# Altium schematic symbol library jlcpcb_2025_04_capacitors_extended_1206.schlib: 2503 symbols (part 7 of 14) (continued)
## CC1206KKX5R8BB106
designator C?  Capacitance: 10uF  (hidden comment: *)
Capacitor, Ceramic (MLCC), 10uF, ±10%, 25V, X5R, ±10%, SMD 1206; Manufacturer: YAGEO; Manufacturer Part Number: CC1206KKX5R8BB106; Package Size: 1206; JLCPCB Basic Part: No; JLCPCB Part Number: C128855; Supplier 1: LCSC; Category: Capacitors - MLCC; Supplier Part Number 1: C128855; Tolerance: ±10%; Voltage Rating: 25V; Temperature Coefficient: X5R; RoHS: Yes; ComponentLink1Description: Datasheet; ComponentLink1URL: https://wmsc.lcsc.com/wmsc/upload/file/pdf/v2/lcsc/2407081117_YAGEO-CC1206KKX5R8BB106_C128855.pdf; ComponentLink2Description: JLCPCB Part URL; ComponentLink2URL: https://jlcpcb.com/partdetail/C128855; ComponentLink3Description: LCSC Part URL; ComponentLink3URL: https://lcsc.com/product-detail/Multilayer-Ceramic-Capacitors-MLCC---SMD-SMT_YAGEO-YAGEO-CC1206KKX5R8BB106_C128855.html
footprint CAP-1206 (1206 (3216M) Capacitor)
pins: 1, 2

## CC1206KKX5R8BB225
designator C?  Capacitance: 2.2uF  (hidden comment: *)
Capacitor, Ceramic (MLCC), 2.2uF, ±10%, 25V, X5R, ±10%, SMD 1206; Manufacturer: YAGEO; Manufacturer Part Number: CC1206KKX5R8BB225; Package Size: 1206; JLCPCB Basic Part: No; JLCPCB Part Number: C577207; Supplier 1: LCSC; Category: Capacitors - MLCC; Supplier Part Number 1: C577207; Tolerance: ±10%; Voltage Rating: 25V; Temperature Coefficient: X5R; RoHS: Yes; ComponentLink1Description: Datasheet; ComponentLink1URL: https://wmsc.lcsc.com/wmsc/upload/file/pdf/v2/lcsc/2407081117_YAGEO-CC1206KKX5R8BB225_C577207.pdf; ComponentLink2Description: JLCPCB Part URL; ComponentLink2URL: https://jlcpcb.com/partdetail/C577207; ComponentLink3Description: LCSC Part URL; ComponentLink3URL: https://lcsc.com/product-detail/Multilayer-Ceramic-Capacitors-MLCC---SMD-SMT_YAGEO-YAGEO-CC1206KKX5R8BB225_C577207.html
footprint CAP-1206 (1206 (3216M) Capacitor)
pins: 1, 2

## CC1206KKX5R8BB226
designator C?  Capacitance: 22uF  (hidden comment: *)
Capacitor, Ceramic (MLCC), 22uF, ±10%, 25V, X5R, ±10%, SMD 1206; Manufacturer: YAGEO; Manufacturer Part Number: CC1206KKX5R8BB226; Package Size: 1206; JLCPCB Basic Part: No; JLCPCB Part Number: C2178233; Supplier 1: LCSC; Category: Capacitors - MLCC; Supplier Part Number 1: C2178233; Tolerance: ±10%; Voltage Rating: 25V; Temperature Coefficient: X5R; RoHS: Yes; ComponentLink1Description: Datasheet; ComponentLink1URL: https://wmsc.lcsc.com/wmsc/upload/file/pdf/v2/lcsc/2407081117_YAGEO-CC1206KKX5R8BB226_C2178233.pdf; ComponentLink2Description: JLCPCB Part URL; ComponentLink2URL: https://jlcpcb.com/partdetail/C2178233; ComponentLink3Description: LCSC Part URL; ComponentLink3URL: https://lcsc.com/product-detail/Multilayer-Ceramic-Capacitors-MLCC---SMD-SMT_YAGEO-YAGEO-CC1206KKX5R8BB226_C2178233.html
footprint CAP-1206 (1206 (3216M) Capacitor)
pins: 1, 2

## CC1206KKX5R8BB475
designator C?  Capacitance: 4.7uF  (hidden comment: *)
Capacitor, Ceramic (MLCC), 4.7uF, ±10%, 25V, X5R, ±10%, SMD 1206; Manufacturer: YAGEO; Manufacturer Part Number: CC1206KKX5R8BB475; Package Size: 1206; JLCPCB Basic Part: No; JLCPCB Part Number: C577208; Supplier 1: LCSC; Category: Capacitors - MLCC; Supplier Part Number 1: C577208; Tolerance: ±10%; Voltage Rating: 25V; Temperature Coefficient: X5R; RoHS: Yes; ComponentLink1Description: Datasheet; ComponentLink1URL: https://wmsc.lcsc.com/wmsc/upload/file/pdf/v2/lcsc/2407081117_YAGEO-CC1206KKX5R8BB475_C577208.pdf; ComponentLink2Description: JLCPCB Part URL; ComponentLink2URL: https://jlcpcb.com/partdetail/C577208; ComponentLink3Description: LCSC Part URL; ComponentLink3URL: https://lcsc.com/product-detail/Multilayer-Ceramic-Capacitors-MLCC---SMD-SMT_YAGEO-YAGEO-CC1206KKX5R8BB475_C577208.html
footprint CAP-1206 (1206 (3216M) Capacitor)
pins: 1, 2

## CC1206KKX5R9BB105
designator C?  Capacitance: 1uF  (hidden comment: *)
Capacitor, Ceramic (MLCC), 1uF, ±10%, 50V, X5R, ±10%, SMD 1206; Manufacturer: YAGEO; Manufacturer Part Number: CC1206KKX5R9BB105; Package Size: 1206; JLCPCB Basic Part: No; JLCPCB Part Number: C577209; Supplier 1: LCSC; Category: Capacitors - MLCC; Supplier Part Number 1: C577209; Tolerance: ±10%; Voltage Rating: 50V; Temperature Coefficient: X5R; RoHS: Yes; ComponentLink1Description: Datasheet; ComponentLink1URL: https://wmsc.lcsc.com/wmsc/upload/file/pdf/v2/lcsc/2407081117_YAGEO-CC1206KKX5R9BB105_C577209.pdf; ComponentLink2Description: JLCPCB Part URL; ComponentLink2URL: https://jlcpcb.com/partdetail/C577209; ComponentLink3Description: LCSC Part URL; ComponentLink3URL: https://lcsc.com/product-detail/Multilayer-Ceramic-Capacitors-MLCC---SMD-SMT_YAGEO-YAGEO-CC1206KKX5R9BB105_C577209.html
footprint CAP-1206 (1206 (3216M) Capacitor)
pins: 1, 2

## CC1206KKX5R9BB106
designator C?  Capacitance: 10uF  (hidden comment: *)
Capacitor, Ceramic (MLCC), 10uF, ±10%, 50V, X5R, ±10%, SMD 1206; Manufacturer: YAGEO; Manufacturer Part Number: CC1206KKX5R9BB106; Package Size: 1206; JLCPCB Basic Part: No; JLCPCB Part Number: C100122; Supplier 1: LCSC; Category: Capacitors - MLCC; Supplier Part Number 1: C100122; Tolerance: ±10%; Voltage Rating: 50V; Temperature Coefficient: X5R; RoHS: Yes; ComponentLink1Description: Datasheet; ComponentLink1URL: https://wmsc.lcsc.com/wmsc/upload/file/pdf/v2/lcsc/2407081117_YAGEO-CC1206KKX5R9BB106_C100122.pdf; ComponentLink2Description: JLCPCB Part URL; ComponentLink2URL: https://jlcpcb.com/partdetail/C100122; ComponentLink3Description: LCSC Part URL; ComponentLink3URL: https://lcsc.com/product-detail/Multilayer-Ceramic-Capacitors-MLCC---SMD-SMT_YAGEO-YAGEO-CC1206KKX5R9BB106_C100122.html
footprint CAP-1206 (1206 (3216M) Capacitor)
pins: 1, 2

## CC1206KKX5R9BB225
designator C?  Capacitance: 2.2uF  (hidden comment: *)
Capacitor, Ceramic (MLCC), 2.2uF, ±10%, 50V, X5R, ±10%, SMD 1206; Manufacturer: YAGEO; Manufacturer Part Number: CC1206KKX5R9BB225; Package Size: 1206; JLCPCB Basic Part: No; JLCPCB Part Number: C577210; Supplier 1: LCSC; Category: Capacitors - MLCC; Supplier Part Number 1: C577210; Tolerance: ±10%; Voltage Rating: 50V; Temperature Coefficient: X5R; RoHS: Yes; ComponentLink1Description: Datasheet; ComponentLink1URL: https://wmsc.lcsc.com/wmsc/upload/file/pdf/v2/lcsc/2407081117_YAGEO-CC1206KKX5R9BB225_C577210.pdf; ComponentLink2Description: JLCPCB Part URL; ComponentLink2URL: https://jlcpcb.com/partdetail/C577210; ComponentLink3Description: LCSC Part URL; ComponentLink3URL: https://lcsc.com/product-detail/Multilayer-Ceramic-Capacitors-MLCC---SMD-SMT_YAGEO-YAGEO-CC1206KKX5R9BB225_C577210.html
footprint CAP-1206 (1206 (3216M) Capacitor)
pins: 1, 2

## CC1206KKX5R9BB475
designator C?  Capacitance: 4.7uF  (hidden comment: *)
Capacitor, Ceramic (MLCC), 4.7uF, ±10%, 50V, X5R, ±10%, SMD 1206; Manufacturer: YAGEO; Manufacturer Part Number: CC1206KKX5R9BB475; Package Size: 1206; JLCPCB Basic Part: No; JLCPCB Part Number: C723528; Supplier 1: LCSC; Category: Capacitors - MLCC; Supplier Part Number 1: C723528; Tolerance: ±10%; Voltage Rating: 50V; Temperature Coefficient: X5R; RoHS: Yes; ComponentLink1Description: Datasheet; ComponentLink1URL: https://wmsc.lcsc.com/wmsc/upload/file/pdf/v2/lcsc/2407081117_YAGEO-CC1206KKX5R9BB475_C723528.pdf; ComponentLink2Description: JLCPCB Part URL; ComponentLink2URL: https://jlcpcb.com/partdetail/C723528; ComponentLink3Description: LCSC Part URL; ComponentLink3URL: https://lcsc.com/product-detail/Multilayer-Ceramic-Capacitors-MLCC---SMD-SMT_YAGEO-YAGEO-CC1206KKX5R9BB475_C723528.html
footprint CAP-1206 (1206 (3216M) Capacitor)
pins: 1, 2

## CC1206KKX7R0BB104
designator C?  Capacitance: 100nF  (hidden comment: *)
Capacitor, Ceramic (MLCC), 100nF, ±10%, 100V, X7R, ±10%, SMD 1206; Manufacturer: YAGEO; Manufacturer Part Number: CC1206KKX7R0BB104; Package Size: 1206; JLCPCB Basic Part: No; JLCPCB Part Number: C107181; Supplier 1: LCSC; Category: Capacitors - MLCC; Supplier Part Number 1: C107181; Tolerance: ±10%; Voltage Rating: 100V; Temperature Coefficient: X7R; RoHS: Yes; ComponentLink1Description: Datasheet; ComponentLink1URL: https://wmsc.lcsc.com/wmsc/upload/file/pdf/v2/lcsc/2304140030_YAGEO-CC1206KKX7R0BB104_C107181.pdf; ComponentLink2Description: JLCPCB Part URL; ComponentLink2URL: https://jlcpcb.com/partdetail/C107181; ComponentLink3Description: LCSC Part URL; ComponentLink3URL: https://lcsc.com/product-detail/Multilayer-Ceramic-Capacitors-MLCC---SMD-SMT_YAGEO-YAGEO-CC1206KKX7R0BB104_C107181.html
footprint CAP-1206 (1206 (3216M) Capacitor)
pins: 1, 2

## CC1206KKX7R0BB105
designator C?  Capacitance: 1uF  (hidden comment: *)
Capacitor, Ceramic (MLCC), 1uF, ±10%, 100V, X7R, ±10%, SMD 1206; Manufacturer: YAGEO; Manufacturer Part Number: CC1206KKX7R0BB105; Package Size: 1206; JLCPCB Basic Part: No; JLCPCB Part Number: C70463; Supplier 1: LCSC; Category: Capacitors - MLCC; Supplier Part Number 1: C70463; Tolerance: ±10%; Voltage Rating: 100V; Temperature Coefficient: X7R; RoHS: Yes; ComponentLink1Description: Datasheet; ComponentLink1URL: https://wmsc.lcsc.com/wmsc/upload/file/pdf/v2/lcsc/2304140030_YAGEO-CC1206KKX7R0BB105_C70463.pdf; ComponentLink2Description: JLCPCB Part URL; ComponentLink2URL: https://jlcpcb.com/partdetail/C70463; ComponentLink3Description: LCSC Part URL; ComponentLink3URL: https://lcsc.com/product-detail/Multilayer-Ceramic-Capacitors-MLCC---SMD-SMT_YAGEO-YAGEO-CC1206KKX7R0BB105_C70463.html
footprint CAP-1206 (1206 (3216M) Capacitor)
pins: 1, 2

## CC1206KKX7R0BB224
designator C?  Capacitance: 220nF  (hidden comment: *)
Capacitor, Ceramic (MLCC), 220nF, ±10%, 100V, X7R, ±10%, SMD 1206; Manufacturer: YAGEO; Manufacturer Part Number: CC1206KKX7R0BB224; Package Size: 1206; JLCPCB Basic Part: No; JLCPCB Part Number: C113892; Supplier 1: LCSC; Category: Capacitors - MLCC; Supplier Part Number 1: C113892; Tolerance: ±10%; Voltage Rating: 100V; Temperature Coefficient: X7R; RoHS: Yes; ComponentLink1Description: Datasheet; ComponentLink1URL: https://wmsc.lcsc.com/wmsc/upload/file/pdf/v2/lcsc/2304140030_YAGEO-CC1206KKX7R0BB224_C113892.pdf; ComponentLink2Description: JLCPCB Part URL; ComponentLink2URL: https://jlcpcb.com/partdetail/C113892; ComponentLink3Description: LCSC Part URL; ComponentLink3URL: https://lcsc.com/product-detail/Multilayer-Ceramic-Capacitors-MLCC---SMD-SMT_YAGEO-YAGEO-CC1206KKX7R0BB224_C113892.html
footprint CAP-1206 (1206 (3216M) Capacitor)
pins: 1, 2

## CC1206KKX7R0BB225
designator C?  Capacitance: 2.2uF  (hidden comment: *)
Capacitor, Ceramic (MLCC), 2.2uF, ±10%, 100V, X7R, ±10%, SMD 1206; Manufacturer: YAGEO; Manufacturer Part Number: CC1206KKX7R0BB225; Package Size: 1206; JLCPCB Basic Part: No; JLCPCB Part Number: C577211; Supplier 1: LCSC; Category: Capacitors - MLCC; Supplier Part Number 1: C577211; Tolerance: ±10%; Voltage Rating: 100V; Temperature Coefficient: X7R; RoHS: Yes; ComponentLink1Description: Datasheet; ComponentLink1URL: https://wmsc.lcsc.com/wmsc/upload/file/pdf/v2/lcsc/2112151030_YAGEO-CC1206KKX7R0BB225_C577211.pdf; ComponentLink2Description: JLCPCB Part URL; ComponentLink2URL: https://jlcpcb.com/partdetail/C577211; ComponentLink3Description: LCSC Part URL; ComponentLink3URL: https://lcsc.com/product-detail/Multilayer-Ceramic-Capacitors-MLCC---SMD-SMT_YAGEO-YAGEO-CC1206KKX7R0BB225_C577211.html
footprint CAP-1206 (1206 (3216M) Capacitor)
pins: 1, 2

## CC1206KKX7R0BB334
designator C?  Capacitance: 330nF  (hidden comment: *)
Capacitor, Ceramic (MLCC), 330nF, ±10%, 100V, X7R, ±10%, SMD 1206; Manufacturer: YAGEO; Manufacturer Part Number: CC1206KKX7R0BB334; Package Size: 1206; JLCPCB Basic Part: No; JLCPCB Part Number: C577212; Supplier 1: LCSC; Category: Capacitors - MLCC; Supplier Part Number 1: C577212; Tolerance: ±10%; Voltage Rating: 100V; Temperature Coefficient: X7R; RoHS: Yes; ComponentLink1Description: Datasheet; ComponentLink1URL: https://wmsc.lcsc.com/wmsc/upload/file/pdf/v2/lcsc/2206021745_YAGEO-CC1206KKX7R0BB334_C577212.pdf; ComponentLink2Description: JLCPCB Part URL; ComponentLink2URL: https://jlcpcb.com/partdetail/C577212; ComponentLink3Description: LCSC Part URL; ComponentLink3URL: https://lcsc.com/product-detail/Multilayer-Ceramic-Capacitors-MLCC---SMD-SMT_YAGEO-YAGEO-CC1206KKX7R0BB334_C577212.html
footprint CAP-1206 (1206 (3216M) Capacitor)
pins: 1, 2

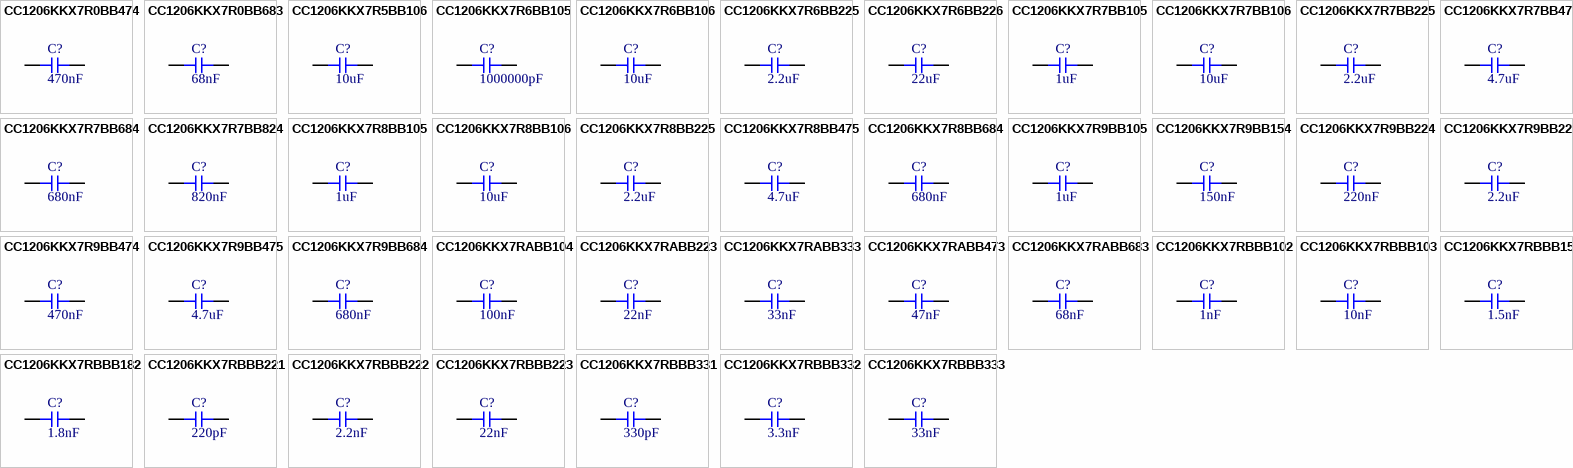
[diagram p30: symbols CC1206KKX7R0BB474 to CC1206KKX7RBBB333]

## CC1206KKX7R0BB474
designator C?  Capacitance: 470nF  (hidden comment: *)
Capacitor, Ceramic (MLCC), 470nF, ±10%, 100V, X7R, ±10%, SMD 1206; Manufacturer: YAGEO; Manufacturer Part Number: CC1206KKX7R0BB474; Package Size: 1206; JLCPCB Basic Part: No; JLCPCB Part Number: C107182; Supplier 1: LCSC; Category: Capacitors - MLCC; Supplier Part Number 1: C107182; Tolerance: ±10%; Voltage Rating: 100V; Temperature Coefficient: X7R; RoHS: Yes; ComponentLink1Description: Datasheet; ComponentLink1URL: https://wmsc.lcsc.com/wmsc/upload/file/pdf/v2/lcsc/2304140030_YAGEO-CC1206KKX7R0BB474_C107182.pdf; ComponentLink2Description: JLCPCB Part URL; ComponentLink2URL: https://jlcpcb.com/partdetail/C107182; ComponentLink3Description: LCSC Part URL; ComponentLink3URL: https://lcsc.com/product-detail/Multilayer-Ceramic-Capacitors-MLCC---SMD-SMT_YAGEO-YAGEO-CC1206KKX7R0BB474_C107182.html
footprint CAP-1206 (1206 (3216M) Capacitor)
pins: 1, 2

## CC1206KKX7R0BB683
designator C?  Capacitance: 68nF  (hidden comment: *)
Capacitor, Ceramic (MLCC), 68nF, ±10%, 100V, X7R, ±10%, SMD 1206; Manufacturer: YAGEO; Manufacturer Part Number: CC1206KKX7R0BB683; Package Size: 1206; JLCPCB Basic Part: No; JLCPCB Part Number: C327130; Supplier 1: LCSC; Category: Capacitors - MLCC; Supplier Part Number 1: C327130; Tolerance: ±10%; Voltage Rating: 100V; Temperature Coefficient: X7R; RoHS: Yes; ComponentLink1Description: Datasheet; ComponentLink1URL: https://wmsc.lcsc.com/wmsc/upload/file/pdf/v2/lcsc/1811141240_YAGEO-CC1206KKX7R0BB683_C327130.pdf; ComponentLink2Description: JLCPCB Part URL; ComponentLink2URL: https://jlcpcb.com/partdetail/C327130; ComponentLink3Description: LCSC Part URL; ComponentLink3URL: https://lcsc.com/product-detail/Multilayer-Ceramic-Capacitors-MLCC---SMD-SMT_YAGEO-YAGEO-CC1206KKX7R0BB683_C327130.html
footprint CAP-1206 (1206 (3216M) Capacitor)
pins: 1, 2

## CC1206KKX7R5BB106
designator C?  Capacitance: 10uF  (hidden comment: *)
Capacitor, Ceramic (MLCC), 10uF, ±10%, 6.3V, X7R, ±10%, SMD 1206; Manufacturer: YAGEO; Manufacturer Part Number: CC1206KKX7R5BB106; Package Size: 1206; JLCPCB Basic Part: No; JLCPCB Part Number: C2175333; Supplier 1: LCSC; Category: Capacitors - MLCC; Supplier Part Number 1: C2175333; Tolerance: ±10%; Voltage Rating: 6.3V; Temperature Coefficient: X7R; RoHS: Yes; ComponentLink1Description: Datasheet; ComponentLink1URL: https://wmsc.lcsc.com/wmsc/upload/file/pdf/v2/lcsc/2202040730_YAGEO-CC1206KKX7R5BB106_C2175333.pdf; ComponentLink2Description: JLCPCB Part URL; ComponentLink2URL: https://jlcpcb.com/partdetail/C2175333; ComponentLink3Description: LCSC Part URL; ComponentLink3URL: https://lcsc.com/product-detail/Multilayer-Ceramic-Capacitors-MLCC---SMD-SMT_YAGEO-YAGEO-CC1206KKX7R5BB106_C2175333.html
footprint CAP-1206 (1206 (3216M) Capacitor)
pins: 1, 2

## CC1206KKX7R6BB105
designator C?  Capacitance: 1000000pF  (hidden comment: *)
Capacitor, Ceramic (MLCC), 1000000pF, ±10%, 10V, X7R, ±10%, SMD 1206; Manufacturer: YAGEO; Manufacturer Part Number: CC1206KKX7R6BB105; Package Size: 1206; JLCPCB Basic Part: No; JLCPCB Part Number: C577213; Supplier 1: LCSC; Category: Capacitors - MLCC; Supplier Part Number 1: C577213; Tolerance: ±10%; Voltage Rating: 10V; Temperature Coefficient: X7R; RoHS: Yes; ComponentLink1Description: Datasheet; ComponentLink1URL: https://wmsc.lcsc.com/wmsc/upload/file/pdf/v2/lcsc/2211281000_YAGEO-CC1206KKX7R6BB105_C577213.pdf; ComponentLink2Description: JLCPCB Part URL; ComponentLink2URL: https://jlcpcb.com/partdetail/C577213; ComponentLink3Description: LCSC Part URL; ComponentLink3URL: https://lcsc.com/product-detail/Multilayer-Ceramic-Capacitors-MLCC---SMD-SMT_YAGEO-YAGEO-CC1206KKX7R6BB105_C577213.html
footprint CAP-1206 (1206 (3216M) Capacitor)
pins: 1, 2

## CC1206KKX7R6BB106
designator C?  Capacitance: 10uF  (hidden comment: *)
Capacitor, Ceramic (MLCC), 10uF, ±10%, 10V, X7R, ±10%, SMD 1206; Manufacturer: YAGEO; Manufacturer Part Number: CC1206KKX7R6BB106; Package Size: 1206; JLCPCB Basic Part: No; JLCPCB Part Number: C577214; Supplier 1: LCSC; Category: Capacitors - MLCC; Supplier Part Number 1: C577214; Tolerance: ±10%; Voltage Rating: 10V; Temperature Coefficient: X7R; RoHS: Yes; ComponentLink1Description: Datasheet; ComponentLink1URL: https://wmsc.lcsc.com/wmsc/upload/file/pdf/v2/lcsc/2204121100_YAGEO-CC1206KKX7R6BB106_C577214.pdf; ComponentLink2Description: JLCPCB Part URL; ComponentLink2URL: https://jlcpcb.com/partdetail/C577214; ComponentLink3Description: LCSC Part URL; ComponentLink3URL: https://lcsc.com/product-detail/Multilayer-Ceramic-Capacitors-MLCC---SMD-SMT_YAGEO-YAGEO-CC1206KKX7R6BB106_C577214.html
footprint CAP-1206 (1206 (3216M) Capacitor)
pins: 1, 2

## CC1206KKX7R6BB225
designator C?  Capacitance: 2.2uF  (hidden comment: *)
Capacitor, Ceramic (MLCC), 2.2uF, ±10%, 10V, X7R, ±10%, SMD 1206; Manufacturer: YAGEO; Manufacturer Part Number: CC1206KKX7R6BB225; Package Size: 1206; JLCPCB Basic Part: No; JLCPCB Part Number: C326852; Supplier 1: LCSC; Category: Capacitors - MLCC; Supplier Part Number 1: C326852; Tolerance: ±10%; Voltage Rating: 10V; Temperature Coefficient: X7R; RoHS: Yes; ComponentLink1Description: Datasheet; ComponentLink1URL: https://wmsc.lcsc.com/wmsc/upload/file/pdf/v2/lcsc/2311211121_YAGEO-CC1206KKX7R6BB225_C326852.pdf; ComponentLink2Description: JLCPCB Part URL; ComponentLink2URL: https://jlcpcb.com/partdetail/C326852; ComponentLink3Description: LCSC Part URL; ComponentLink3URL: https://lcsc.com/product-detail/Multilayer-Ceramic-Capacitors-MLCC---SMD-SMT_YAGEO-YAGEO-CC1206KKX7R6BB225_C326852.html
footprint CAP-1206 (1206 (3216M) Capacitor)
pins: 1, 2

## CC1206KKX7R6BB226
designator C?  Capacitance: 22uF  (hidden comment: *)
Capacitor, Ceramic (MLCC), 22uF, ±10%, 10V, X7R, ±10%, SMD 1206; Manufacturer: YAGEO; Manufacturer Part Number: CC1206KKX7R6BB226; Package Size: 1206; JLCPCB Basic Part: No; JLCPCB Part Number: C110045; Supplier 1: LCSC; Category: Capacitors - MLCC; Supplier Part Number 1: C110045; Tolerance: ±10%; Voltage Rating: 10V; Temperature Coefficient: X7R; RoHS: Yes; ComponentLink1Description: Datasheet; ComponentLink1URL: https://wmsc.lcsc.com/wmsc/upload/file/pdf/v2/lcsc/2207131630_YAGEO-CC1206KKX7R6BB226_C110045.pdf; ComponentLink2Description: JLCPCB Part URL; ComponentLink2URL: https://jlcpcb.com/partdetail/C110045; ComponentLink3Description: LCSC Part URL; ComponentLink3URL: https://lcsc.com/product-detail/Multilayer-Ceramic-Capacitors-MLCC---SMD-SMT_YAGEO-YAGEO-CC1206KKX7R6BB226_C110045.html
footprint CAP-1206 (1206 (3216M) Capacitor)
pins: 1, 2

## CC1206KKX7R7BB105
designator C?  Capacitance: 1uF  (hidden comment: *)
Capacitor, Ceramic (MLCC), 1uF, ±10%, 16V, X7R, ±10%, SMD 1206; Manufacturer: YAGEO; Manufacturer Part Number: CC1206KKX7R7BB105; Package Size: 1206; JLCPCB Basic Part: No; JLCPCB Part Number: C106236; Supplier 1: LCSC; Category: Capacitors - MLCC; Supplier Part Number 1: C106236; Tolerance: ±10%; Voltage Rating: 16V; Temperature Coefficient: X7R; RoHS: Yes; ComponentLink1Description: Datasheet; ComponentLink1URL: https://wmsc.lcsc.com/wmsc/upload/file/pdf/v2/lcsc/2304140030_YAGEO-CC1206KKX7R7BB105_C106236.pdf; ComponentLink2Description: JLCPCB Part URL; ComponentLink2URL: https://jlcpcb.com/partdetail/C106236; ComponentLink3Description: LCSC Part URL; ComponentLink3URL: https://lcsc.com/product-detail/Multilayer-Ceramic-Capacitors-MLCC---SMD-SMT_YAGEO-YAGEO-CC1206KKX7R7BB105_C106236.html
footprint CAP-1206 (1206 (3216M) Capacitor)
pins: 1, 2

## CC1206KKX7R7BB106
designator C?  Capacitance: 10uF  (hidden comment: *)
Capacitor, Ceramic (MLCC), 10uF, ±10%, 16V, X7R, ±10%, SMD 1206; Manufacturer: YAGEO; Manufacturer Part Number: CC1206KKX7R7BB106; Package Size: 1206; JLCPCB Basic Part: No; JLCPCB Part Number: C109464; Supplier 1: LCSC; Category: Capacitors - MLCC; Supplier Part Number 1: C109464; Tolerance: ±10%; Voltage Rating: 16V; Temperature Coefficient: X7R; RoHS: Yes; ComponentLink1Description: Datasheet; ComponentLink1URL: https://wmsc.lcsc.com/wmsc/upload/file/pdf/v2/lcsc/2304140030_YAGEO-CC1206KKX7R7BB106_C109464.pdf; ComponentLink2Description: JLCPCB Part URL; ComponentLink2URL: https://jlcpcb.com/partdetail/C109464; ComponentLink3Description: LCSC Part URL; ComponentLink3URL: https://lcsc.com/product-detail/Multilayer-Ceramic-Capacitors-MLCC---SMD-SMT_YAGEO-YAGEO-CC1206KKX7R7BB106_C109464.html
footprint CAP-1206 (1206 (3216M) Capacitor)
pins: 1, 2

## CC1206KKX7R7BB225
designator C?  Capacitance: 2.2uF  (hidden comment: *)
Capacitor, Ceramic (MLCC), 2.2uF, ±10%, 16V, X7R, ±10%, SMD 1206; Manufacturer: YAGEO; Manufacturer Part Number: CC1206KKX7R7BB225; Package Size: 1206; JLCPCB Basic Part: No; JLCPCB Part Number: C107183; Supplier 1: LCSC; Category: Capacitors - MLCC; Supplier Part Number 1: C107183; Tolerance: ±10%; Voltage Rating: 16V; Temperature Coefficient: X7R; RoHS: Yes; ComponentLink1Description: Datasheet; ComponentLink1URL: https://wmsc.lcsc.com/wmsc/upload/file/pdf/v2/lcsc/2304140030_YAGEO-CC1206KKX7R7BB225_C107183.pdf; ComponentLink2Description: JLCPCB Part URL; ComponentLink2URL: https://jlcpcb.com/partdetail/C107183; ComponentLink3Description: LCSC Part URL; ComponentLink3URL: https://lcsc.com/product-detail/Multilayer-Ceramic-Capacitors-MLCC---SMD-SMT_YAGEO-YAGEO-CC1206KKX7R7BB225_C107183.html
footprint CAP-1206 (1206 (3216M) Capacitor)
pins: 1, 2

## CC1206KKX7R7BB475
designator C?  Capacitance: 4.7uF  (hidden comment: *)
Capacitor, Ceramic (MLCC), 4.7uF, ±10%, 16V, X7R, ±10%, SMD 1206; Manufacturer: YAGEO; Manufacturer Part Number: CC1206KKX7R7BB475; Package Size: 1206; JLCPCB Basic Part: No; JLCPCB Part Number: C577216; Supplier 1: LCSC; Category: Capacitors - MLCC; Supplier Part Number 1: C577216; Tolerance: ±10%; Voltage Rating: 16V; Temperature Coefficient: X7R; RoHS: Yes; ComponentLink1Description: Datasheet; ComponentLink1URL: https://wmsc.lcsc.com/wmsc/upload/file/pdf/v2/lcsc/2008171234_YAGEO-CC1206KKX7R7BB475_C577216.pdf; ComponentLink2Description: JLCPCB Part URL; ComponentLink2URL: https://jlcpcb.com/partdetail/C577216; ComponentLink3Description: LCSC Part URL; ComponentLink3URL: https://lcsc.com/product-detail/Multilayer-Ceramic-Capacitors-MLCC---SMD-SMT_YAGEO-YAGEO-CC1206KKX7R7BB475_C577216.html
footprint CAP-1206 (1206 (3216M) Capacitor)
pins: 1, 2

## CC1206KKX7R7BB684
designator C?  Capacitance: 680nF  (hidden comment: *)
Capacitor, Ceramic (MLCC), 680nF, ±10%, 16V, X7R, ±10%, SMD 1206; Manufacturer: YAGEO; Manufacturer Part Number: CC1206KKX7R7BB684; Package Size: 1206; JLCPCB Basic Part: No; JLCPCB Part Number: C577217; Supplier 1: LCSC; Category: Capacitors - MLCC; Supplier Part Number 1: C577217; Tolerance: ±10%; Voltage Rating: 16V; Temperature Coefficient: X7R; RoHS: Yes; ComponentLink1Description: Datasheet; ComponentLink1URL: https://wmsc.lcsc.com/wmsc/upload/file/pdf/v2/lcsc/2204211700_YAGEO-CC1206KKX7R7BB684_C577217.pdf; ComponentLink2Description: JLCPCB Part URL; ComponentLink2URL: https://jlcpcb.com/partdetail/C577217; ComponentLink3Description: LCSC Part URL; ComponentLink3URL: https://lcsc.com/product-detail/Multilayer-Ceramic-Capacitors-MLCC---SMD-SMT_YAGEO-YAGEO-CC1206KKX7R7BB684_C577217.html
footprint CAP-1206 (1206 (3216M) Capacitor)
pins: 1, 2

## CC1206KKX7R7BB824
designator C?  Capacitance: 820nF  (hidden comment: *)
Capacitor, Ceramic (MLCC), 820nF, ±10%, 16V, ±10%, SMD 1206; Manufacturer: YAGEO; Manufacturer Part Number: CC1206KKX7R7BB824; Package Size: 1206; JLCPCB Basic Part: No; JLCPCB Part Number: C726632; Supplier 1: LCSC; Category: Capacitors - MLCC; Supplier Part Number 1: C726632; Tolerance: ±10%; Voltage Rating: 16V; RoHS: Yes; ComponentLink1Description: Datasheet; ComponentLink1URL: https://wmsc.lcsc.com/wmsc/upload/file/pdf/v2/lcsc/2210192100_YAGEO-CC1206KKX7R7BB824_C726632.pdf; ComponentLink2Description: JLCPCB Part URL; ComponentLink2URL: https://jlcpcb.com/partdetail/C726632; ComponentLink3Description: LCSC Part URL; ComponentLink3URL: https://lcsc.com/product-detail/Multilayer-Ceramic-Capacitors-MLCC---SMD-SMT_YAGEO-YAGEO-CC1206KKX7R7BB824_C726632.html
footprint CAP-1206 (1206 (3216M) Capacitor)
pins: 1, 2

## CC1206KKX7R8BB105
designator C?  Capacitance: 1uF  (hidden comment: *)
Capacitor, Ceramic (MLCC), 1uF, ±10%, 25V, X7R, ±10%, SMD 1206; Manufacturer: YAGEO; Manufacturer Part Number: CC1206KKX7R8BB105; Package Size: 1206; JLCPCB Basic Part: No; JLCPCB Part Number: C107184; Supplier 1: LCSC; Category: Capacitors - MLCC; Supplier Part Number 1: C107184; Tolerance: ±10%; Voltage Rating: 25V; Temperature Coefficient: X7R; RoHS: Yes; ComponentLink1Description: Datasheet; ComponentLink1URL: https://wmsc.lcsc.com/wmsc/upload/file/pdf/v2/lcsc/2304140030_YAGEO-CC1206KKX7R8BB105_C107184.pdf; ComponentLink2Description: JLCPCB Part URL; ComponentLink2URL: https://jlcpcb.com/partdetail/C107184; ComponentLink3Description: LCSC Part URL; ComponentLink3URL: https://lcsc.com/product-detail/Multilayer-Ceramic-Capacitors-MLCC---SMD-SMT_YAGEO-YAGEO-CC1206KKX7R8BB105_C107184.html
footprint CAP-1206 (1206 (3216M) Capacitor)
pins: 1, 2

## CC1206KKX7R8BB106
designator C?  Capacitance: 10uF  (hidden comment: *)
Capacitor, Ceramic (MLCC), 10uF, ±10%, 25V, X7R, ±10%, SMD 1206; Manufacturer: YAGEO; Manufacturer Part Number: CC1206KKX7R8BB106; Package Size: 1206; JLCPCB Basic Part: No; JLCPCB Part Number: C70462; Supplier 1: LCSC; Category: Capacitors - MLCC; Supplier Part Number 1: C70462; Tolerance: ±10%; Voltage Rating: 25V; Temperature Coefficient: X7R; RoHS: Yes; ComponentLink1Description: Datasheet; ComponentLink1URL: https://wmsc.lcsc.com/wmsc/upload/file/pdf/v2/lcsc/2304140030_YAGEO-CC1206KKX7R8BB106_C70462.pdf; ComponentLink2Description: JLCPCB Part URL; ComponentLink2URL: https://jlcpcb.com/partdetail/C70462; ComponentLink3Description: LCSC Part URL; ComponentLink3URL: https://lcsc.com/product-detail/Multilayer-Ceramic-Capacitors-MLCC---SMD-SMT_YAGEO-YAGEO-CC1206KKX7R8BB106_C70462.html
footprint CAP-1206 (1206 (3216M) Capacitor)
pins: 1, 2

## CC1206KKX7R8BB225
designator C?  Capacitance: 2.2uF  (hidden comment: *)
Capacitor, Ceramic (MLCC), 2.2uF, ±10%, 25V, X7R, ±10%, SMD 1206; Manufacturer: YAGEO; Manufacturer Part Number: CC1206KKX7R8BB225; Package Size: 1206; JLCPCB Basic Part: No; JLCPCB Part Number: C113893; Supplier 1: LCSC; Category: Capacitors - MLCC; Supplier Part Number 1: C113893; Tolerance: ±10%; Voltage Rating: 25V; Temperature Coefficient: X7R; RoHS: Yes; ComponentLink1Description: Datasheet; ComponentLink1URL: https://wmsc.lcsc.com/wmsc/upload/file/pdf/v2/lcsc/2304140030_YAGEO-CC1206KKX7R8BB225_C113893.pdf; ComponentLink2Description: JLCPCB Part URL; ComponentLink2URL: https://jlcpcb.com/partdetail/C113893; ComponentLink3Description: LCSC Part URL; ComponentLink3URL: https://lcsc.com/product-detail/Multilayer-Ceramic-Capacitors-MLCC---SMD-SMT_YAGEO-YAGEO-CC1206KKX7R8BB225_C113893.html
footprint CAP-1206 (1206 (3216M) Capacitor)
pins: 1, 2

## CC1206KKX7R8BB475
designator C?  Capacitance: 4.7uF  (hidden comment: *)
Capacitor, Ceramic (MLCC), 4.7uF, ±10%, 25V, X7R, ±10%, SMD 1206; Manufacturer: YAGEO; Manufacturer Part Number: CC1206KKX7R8BB475; Package Size: 1206; JLCPCB Basic Part: No; JLCPCB Part Number: C277508; Supplier 1: LCSC; Category: Capacitors - MLCC; Supplier Part Number 1: C277508; Tolerance: ±10%; Voltage Rating: 25V; Temperature Coefficient: X7R; RoHS: Yes; ComponentLink1Description: Datasheet; ComponentLink1URL: https://wmsc.lcsc.com/wmsc/upload/file/pdf/v2/lcsc/2304140030_YAGEO-CC1206KKX7R8BB475_C277508.pdf; ComponentLink2Description: JLCPCB Part URL; ComponentLink2URL: https://jlcpcb.com/partdetail/C277508; ComponentLink3Description: LCSC Part URL; ComponentLink3URL: https://lcsc.com/product-detail/Multilayer-Ceramic-Capacitors-MLCC---SMD-SMT_YAGEO-YAGEO-CC1206KKX7R8BB475_C277508.html
footprint CAP-1206 (1206 (3216M) Capacitor)
pins: 1, 2

## CC1206KKX7R8BB684
designator C?  Capacitance: 680nF  (hidden comment: *)
Capacitor, Ceramic (MLCC), 680nF, ±10%, 25V, X7R, ±10%, SMD 1206; Manufacturer: YAGEO; Manufacturer Part Number: CC1206KKX7R8BB684; Package Size: 1206; JLCPCB Basic Part: No; JLCPCB Part Number: C577219; Supplier 1: LCSC; Category: Capacitors - MLCC; Supplier Part Number 1: C577219; Tolerance: ±10%; Voltage Rating: 25V; Temperature Coefficient: X7R; RoHS: Yes; ComponentLink1Description: Datasheet; ComponentLink1URL: https://wmsc.lcsc.com/wmsc/upload/file/pdf/v2/lcsc/2008171234_YAGEO-CC1206KKX7R8BB684_C577219.pdf; ComponentLink2Description: JLCPCB Part URL; ComponentLink2URL: https://jlcpcb.com/partdetail/C577219; ComponentLink3Description: LCSC Part URL; ComponentLink3URL: https://lcsc.com/product-detail/Multilayer-Ceramic-Capacitors-MLCC---SMD-SMT_YAGEO-YAGEO-CC1206KKX7R8BB684_C577219.html
footprint CAP-1206 (1206 (3216M) Capacitor)
pins: 1, 2

## CC1206KKX7R9BB105
designator C?  Capacitance: 1uF  (hidden comment: *)
Capacitor, Ceramic (MLCC), 1uF, ±10%, 50V, X7R, ±10%, SMD 1206; Manufacturer: YAGEO; Manufacturer Part Number: CC1206KKX7R9BB105; Package Size: 1206; JLCPCB Basic Part: No; JLCPCB Part Number: C107185; Supplier 1: LCSC; Category: Capacitors - MLCC; Supplier Part Number 1: C107185; Tolerance: ±10%; Voltage Rating: 50V; Temperature Coefficient: X7R; RoHS: Yes; ComponentLink1Description: Datasheet; ComponentLink1URL: https://wmsc.lcsc.com/wmsc/upload/file/pdf/v2/lcsc/2208111800_YAGEO-CC1206KKX7R9BB105_C107185.pdf; ComponentLink2Description: JLCPCB Part URL; ComponentLink2URL: https://jlcpcb.com/partdetail/C107185; ComponentLink3Description: LCSC Part URL; ComponentLink3URL: https://lcsc.com/product-detail/Multilayer-Ceramic-Capacitors-MLCC---SMD-SMT_YAGEO-YAGEO-CC1206KKX7R9BB105_C107185.html
footprint CAP-1206 (1206 (3216M) Capacitor)
pins: 1, 2

## CC1206KKX7R9BB154
designator C?  Capacitance: 150nF  (hidden comment: *)
Capacitor, Ceramic (MLCC), 150nF, ±10%, 50V, X7R, ±10%, SMD 1206; Manufacturer: YAGEO; Manufacturer Part Number: CC1206KKX7R9BB154; Package Size: 1206; JLCPCB Basic Part: No; JLCPCB Part Number: C326826; Supplier 1: LCSC; Category: Capacitors - MLCC; Supplier Part Number 1: C326826; Tolerance: ±10%; Voltage Rating: 50V; Temperature Coefficient: X7R; RoHS: Yes; ComponentLink1Description: Datasheet; ComponentLink1URL: https://wmsc.lcsc.com/wmsc/upload/file/pdf/v2/lcsc/1811141233_YAGEO-CC1206KKX7R9BB154_C326826.pdf; ComponentLink2Description: JLCPCB Part URL; ComponentLink2URL: https://jlcpcb.com/partdetail/C326826; ComponentLink3Description: LCSC Part URL; ComponentLink3URL: https://lcsc.com/product-detail/Multilayer-Ceramic-Capacitors-MLCC---SMD-SMT_YAGEO-YAGEO-CC1206KKX7R9BB154_C326826.html
footprint CAP-1206 (1206 (3216M) Capacitor)
pins: 1, 2

## CC1206KKX7R9BB224
designator C?  Capacitance: 220nF  (hidden comment: *)
Capacitor, Ceramic (MLCC), 220nF, ±10%, 50V, X7R, ±10%, SMD 1206; Manufacturer: YAGEO; Manufacturer Part Number: CC1206KKX7R9BB224; Package Size: 1206; JLCPCB Basic Part: No; JLCPCB Part Number: C107186; Supplier 1: LCSC; Category: Capacitors - MLCC; Supplier Part Number 1: C107186; Tolerance: ±10%; Voltage Rating: 50V; Temperature Coefficient: X7R; RoHS: Yes; ComponentLink1Description: Datasheet; ComponentLink1URL: https://wmsc.lcsc.com/wmsc/upload/file/pdf/v2/lcsc/2304140030_YAGEO-CC1206KKX7R9BB224_C107186.pdf; ComponentLink2Description: JLCPCB Part URL; ComponentLink2URL: https://jlcpcb.com/partdetail/C107186; ComponentLink3Description: LCSC Part URL; ComponentLink3URL: https://lcsc.com/product-detail/Multilayer-Ceramic-Capacitors-MLCC---SMD-SMT_YAGEO-YAGEO-CC1206KKX7R9BB224_C107186.html
footprint CAP-1206 (1206 (3216M) Capacitor)
pins: 1, 2

## CC1206KKX7R9BB225
designator C?  Capacitance: 2.2uF  (hidden comment: *)
Capacitor, Ceramic (MLCC), 2.2uF, ±10%, 50V, X7R, ±10%, SMD 1206; Manufacturer: YAGEO; Manufacturer Part Number: CC1206KKX7R9BB225; Package Size: 1206; JLCPCB Basic Part: No; JLCPCB Part Number: C133050; Supplier 1: LCSC; Category: Capacitors - MLCC; Supplier Part Number 1: C133050; Tolerance: ±10%; Voltage Rating: 50V; Temperature Coefficient: X7R; RoHS: Yes; ComponentLink1Description: Datasheet; ComponentLink1URL: https://wmsc.lcsc.com/wmsc/upload/file/pdf/v2/lcsc/2304140030_YAGEO-CC1206KKX7R9BB225_C133050.pdf; ComponentLink2Description: JLCPCB Part URL; ComponentLink2URL: https://jlcpcb.com/partdetail/C133050; ComponentLink3Description: LCSC Part URL; ComponentLink3URL: https://lcsc.com/product-detail/Multilayer-Ceramic-Capacitors-MLCC---SMD-SMT_YAGEO-YAGEO-CC1206KKX7R9BB225_C133050.html
footprint CAP-1206 (1206 (3216M) Capacitor)
pins: 1, 2

## CC1206KKX7R9BB474
designator C?  Capacitance: 470nF  (hidden comment: *)
Capacitor, Ceramic (MLCC), 470nF, ±10%, 50V, X7R, ±10%, SMD 1206; Manufacturer: YAGEO; Manufacturer Part Number: CC1206KKX7R9BB474; Package Size: 1206; JLCPCB Basic Part: No; JLCPCB Part Number: C277483; Supplier 1: LCSC; Category: Capacitors - MLCC; Supplier Part Number 1: C277483; Tolerance: ±10%; Voltage Rating: 50V; Temperature Coefficient: X7R; RoHS: Yes; ComponentLink1Description: Datasheet; ComponentLink1URL: https://wmsc.lcsc.com/wmsc/upload/file/pdf/v2/lcsc/2304140030_YAGEO-CC1206KKX7R9BB474_C277483.pdf; ComponentLink2Description: JLCPCB Part URL; ComponentLink2URL: https://jlcpcb.com/partdetail/C277483; ComponentLink3Description: LCSC Part URL; ComponentLink3URL: https://lcsc.com/product-detail/Multilayer-Ceramic-Capacitors-MLCC---SMD-SMT_YAGEO-YAGEO-CC1206KKX7R9BB474_C277483.html
footprint CAP-1206 (1206 (3216M) Capacitor)
pins: 1, 2

## CC1206KKX7R9BB475
designator C?  Capacitance: 4.7uF  (hidden comment: *)
Capacitor, Ceramic (MLCC), 4.7uF, ±10%, 50V, X7R, ±10%, SMD 1206; Manufacturer: YAGEO; Manufacturer Part Number: CC1206KKX7R9BB475; Package Size: 1206; JLCPCB Basic Part: No; JLCPCB Part Number: C132170; Supplier 1: LCSC; Category: Capacitors - MLCC; Supplier Part Number 1: C132170; Tolerance: ±10%; Voltage Rating: 50V; Temperature Coefficient: X7R; RoHS: Yes; ComponentLink1Description: Datasheet; ComponentLink1URL: https://wmsc.lcsc.com/wmsc/upload/file/pdf/v2/lcsc/2304140030_YAGEO-CC1206KKX7R9BB475_C132170.pdf; ComponentLink2Description: JLCPCB Part URL; ComponentLink2URL: https://jlcpcb.com/partdetail/C132170; ComponentLink3Description: LCSC Part URL; ComponentLink3URL: https://lcsc.com/product-detail/Multilayer-Ceramic-Capacitors-MLCC---SMD-SMT_YAGEO-YAGEO-CC1206KKX7R9BB475_C132170.html
footprint CAP-1206 (1206 (3216M) Capacitor)
pins: 1, 2

## CC1206KKX7R9BB684
designator C?  Capacitance: 680nF  (hidden comment: *)
Capacitor, Ceramic (MLCC), 680nF, ±10%, 50V, X7R, ±10%, SMD 1206; Manufacturer: YAGEO; Manufacturer Part Number: CC1206KKX7R9BB684; Package Size: 1206; JLCPCB Basic Part: No; JLCPCB Part Number: C145012; Supplier 1: LCSC; Category: Capacitors - MLCC; Supplier Part Number 1: C145012; Tolerance: ±10%; Voltage Rating: 50V; Temperature Coefficient: X7R; RoHS: Yes; ComponentLink1Description: Datasheet; ComponentLink1URL: https://wmsc.lcsc.com/wmsc/upload/file/pdf/v2/lcsc/2007151105_YAGEO-CC1206KKX7R9BB684_C145012.pdf; ComponentLink2Description: JLCPCB Part URL; ComponentLink2URL: https://jlcpcb.com/partdetail/C145012; ComponentLink3Description: LCSC Part URL; ComponentLink3URL: https://lcsc.com/product-detail/Multilayer-Ceramic-Capacitors-MLCC---SMD-SMT_YAGEO-YAGEO-CC1206KKX7R9BB684_C145012.html
footprint CAP-1206 (1206 (3216M) Capacitor)
pins: 1, 2

## CC1206KKX7RABB104
designator C?  Capacitance: 100nF  (hidden comment: *)
Capacitor, Ceramic (MLCC), 100nF, ±10%, 200V, X7R, ±10%, SMD 1206; Manufacturer: YAGEO; Manufacturer Part Number: CC1206KKX7RABB104; Package Size: 1206; JLCPCB Basic Part: No; JLCPCB Part Number: C113894; Supplier 1: LCSC; Category: Capacitors - MLCC; Supplier Part Number 1: C113894; Tolerance: ±10%; Voltage Rating: 200V; Temperature Coefficient: X7R; RoHS: Yes; ComponentLink1Description: Datasheet; ComponentLink1URL: https://wmsc.lcsc.com/wmsc/upload/file/pdf/v2/lcsc/2304140030_YAGEO-CC1206KKX7RABB104_C113894.pdf; ComponentLink2Description: JLCPCB Part URL; ComponentLink2URL: https://jlcpcb.com/partdetail/C113894; ComponentLink3Description: LCSC Part URL; ComponentLink3URL: https://lcsc.com/product-detail/Multilayer-Ceramic-Capacitors-MLCC---SMD-SMT_YAGEO-YAGEO-CC1206KKX7RABB104_C113894.html
footprint CAP-1206 (1206 (3216M) Capacitor)
pins: 1, 2

## CC1206KKX7RABB223
designator C?  Capacitance: 22nF  (hidden comment: *)
Capacitor, Ceramic (MLCC), 22nF, ±10%, 200V, X7R, ±10%, SMD 1206; Manufacturer: YAGEO; Manufacturer Part Number: CC1206KKX7RABB223; Package Size: 1206; JLCPCB Basic Part: No; JLCPCB Part Number: C113895; Supplier 1: LCSC; Category: Capacitors - MLCC; Supplier Part Number 1: C113895; Tolerance: ±10%; Voltage Rating: 200V; Temperature Coefficient: X7R; RoHS: Yes; ComponentLink1Description: Datasheet; ComponentLink1URL: https://wmsc.lcsc.com/wmsc/upload/file/pdf/v2/lcsc/2009211536_YAGEO-CC1206KKX7RABB223_C113895.pdf; ComponentLink2Description: JLCPCB Part URL; ComponentLink2URL: https://jlcpcb.com/partdetail/C113895; ComponentLink3Description: LCSC Part URL; ComponentLink3URL: https://lcsc.com/product-detail/Multilayer-Ceramic-Capacitors-MLCC---SMD-SMT_YAGEO-YAGEO-CC1206KKX7RABB223_C113895.html
footprint CAP-1206 (1206 (3216M) Capacitor)
pins: 1, 2

## CC1206KKX7RABB333
designator C?  Capacitance: 33nF  (hidden comment: *)
Capacitor, Ceramic (MLCC), 33nF, ±10%, 200V, X7R, ±10%, SMD 1206; Manufacturer: YAGEO; Manufacturer Part Number: CC1206KKX7RABB333; Package Size: 1206; JLCPCB Basic Part: No; JLCPCB Part Number: C527333; Supplier 1: LCSC; Category: Capacitors - MLCC; Supplier Part Number 1: C527333; Tolerance: ±10%; Voltage Rating: 200V; Temperature Coefficient: X7R; RoHS: Yes; ComponentLink1Description: Datasheet; ComponentLink1URL: https://wmsc.lcsc.com/wmsc/upload/file/pdf/v2/lcsc/2006031836_YAGEO-CC1206KKX7RABB333_C527333.pdf; ComponentLink2Description: JLCPCB Part URL; ComponentLink2URL: https://jlcpcb.com/partdetail/C527333; ComponentLink3Description: LCSC Part URL; ComponentLink3URL: https://lcsc.com/product-detail/Multilayer-Ceramic-Capacitors-MLCC---SMD-SMT_YAGEO-YAGEO-CC1206KKX7RABB333_C527333.html
footprint CAP-1206 (1206 (3216M) Capacitor)
pins: 1, 2

## CC1206KKX7RABB473
designator C?  Capacitance: 47nF  (hidden comment: *)
Capacitor, Ceramic (MLCC), 47nF, ±10%, 200V, X7R, ±10%, SMD 1206; Manufacturer: YAGEO; Manufacturer Part Number: CC1206KKX7RABB473; Package Size: 1206; JLCPCB Basic Part: No; JLCPCB Part Number: C327004; Supplier 1: LCSC; Category: Capacitors - MLCC; Supplier Part Number 1: C327004; Tolerance: ±10%; Voltage Rating: 200V; Temperature Coefficient: X7R; RoHS: Yes; ComponentLink1Description: Datasheet; ComponentLink1URL: https://wmsc.lcsc.com/wmsc/upload/file/pdf/v2/lcsc/1811141240_YAGEO-CC1206KKX7RABB473_C327004.pdf; ComponentLink2Description: JLCPCB Part URL; ComponentLink2URL: https://jlcpcb.com/partdetail/C327004; ComponentLink3Description: LCSC Part URL; ComponentLink3URL: https://lcsc.com/product-detail/Multilayer-Ceramic-Capacitors-MLCC---SMD-SMT_YAGEO-YAGEO-CC1206KKX7RABB473_C327004.html
footprint CAP-1206 (1206 (3216M) Capacitor)
pins: 1, 2

## CC1206KKX7RABB683
designator C?  Capacitance: 68nF  (hidden comment: *)
Capacitor, Ceramic (MLCC), 68nF, ±10%, 200V, X7R, ±10%, SMD 1206; Manufacturer: YAGEO; Manufacturer Part Number: CC1206KKX7RABB683; Package Size: 1206; JLCPCB Basic Part: No; JLCPCB Part Number: C527334; Supplier 1: LCSC; Category: Capacitors - MLCC; Supplier Part Number 1: C527334; Tolerance: ±10%; Voltage Rating: 200V; Temperature Coefficient: X7R; RoHS: Yes; ComponentLink1Description: Datasheet; ComponentLink1URL: https://wmsc.lcsc.com/wmsc/upload/file/pdf/v2/lcsc/2006241834_YAGEO-CC1206KKX7RABB683_C527334.pdf; ComponentLink2Description: JLCPCB Part URL; ComponentLink2URL: https://jlcpcb.com/partdetail/C527334; ComponentLink3Description: LCSC Part URL; ComponentLink3URL: https://lcsc.com/product-detail/Multilayer-Ceramic-Capacitors-MLCC---SMD-SMT_YAGEO-YAGEO-CC1206KKX7RABB683_C527334.html
footprint CAP-1206 (1206 (3216M) Capacitor)
pins: 1, 2

## CC1206KKX7RBBB102
designator C?  Capacitance: 1nF  (hidden comment: *)
Capacitor, Ceramic (MLCC), 1nF, ±10%, 500V, X7R, ±10%, SMD 1206; Manufacturer: YAGEO; Manufacturer Part Number: CC1206KKX7RBBB102; Package Size: 1206; JLCPCB Basic Part: No; JLCPCB Part Number: C106240; Supplier 1: LCSC; Category: Capacitors - MLCC; Supplier Part Number 1: C106240; Tolerance: ±10%; Voltage Rating: 500V; Temperature Coefficient: X7R; RoHS: Yes; ComponentLink1Description: Datasheet; ComponentLink1URL: https://wmsc.lcsc.com/wmsc/upload/file/pdf/v2/lcsc/2304140030_YAGEO-CC1206KKX7RBBB102_C106240.pdf; ComponentLink2Description: JLCPCB Part URL; ComponentLink2URL: https://jlcpcb.com/partdetail/C106240; ComponentLink3Description: LCSC Part URL; ComponentLink3URL: https://lcsc.com/product-detail/Multilayer-Ceramic-Capacitors-MLCC---SMD-SMT_YAGEO-YAGEO-CC1206KKX7RBBB102_C106240.html
footprint CAP-1206 (1206 (3216M) Capacitor)
pins: 1, 2

## CC1206KKX7RBBB103
designator C?  Capacitance: 10nF  (hidden comment: *)
Capacitor, Ceramic (MLCC), 10nF, ±10%, 500V, X7R, ±10%, SMD 1206; Manufacturer: YAGEO; Manufacturer Part Number: CC1206KKX7RBBB103; Package Size: 1206; JLCPCB Basic Part: No; JLCPCB Part Number: C106242; Supplier 1: LCSC; Category: Capacitors - MLCC; Supplier Part Number 1: C106242; Tolerance: ±10%; Voltage Rating: 500V; Temperature Coefficient: X7R; RoHS: Yes; ComponentLink1Description: Datasheet; ComponentLink1URL: https://wmsc.lcsc.com/wmsc/upload/file/pdf/v2/lcsc/2304140030_YAGEO-CC1206KKX7RBBB103_C106242.pdf; ComponentLink2Description: JLCPCB Part URL; ComponentLink2URL: https://jlcpcb.com/partdetail/C106242; ComponentLink3Description: LCSC Part URL; ComponentLink3URL: https://lcsc.com/product-detail/Multilayer-Ceramic-Capacitors-MLCC---SMD-SMT_YAGEO-YAGEO-CC1206KKX7RBBB103_C106242.html
footprint CAP-1206 (1206 (3216M) Capacitor)
pins: 1, 2

## CC1206KKX7RBBB152
designator C?  Capacitance: 1.5nF  (hidden comment: *)
Capacitor, Ceramic (MLCC), 1.5nF, ±10%, 500V, X7R, ±10%, SMD 1206; Manufacturer: YAGEO; Manufacturer Part Number: CC1206KKX7RBBB152; Package Size: 1206; JLCPCB Basic Part: No; JLCPCB Part Number: C107187; Supplier 1: LCSC; Category: Capacitors - MLCC; Supplier Part Number 1: C107187; Tolerance: ±10%; Voltage Rating: 500V; Temperature Coefficient: X7R; RoHS: Yes; ComponentLink1Description: Datasheet; ComponentLink1URL: https://wmsc.lcsc.com/wmsc/upload/file/pdf/v2/lcsc/2304140030_YAGEO-CC1206KKX7RBBB152_C107187.pdf; ComponentLink2Description: JLCPCB Part URL; ComponentLink2URL: https://jlcpcb.com/partdetail/C107187; ComponentLink3Description: LCSC Part URL; ComponentLink3URL: https://lcsc.com/product-detail/Multilayer-Ceramic-Capacitors-MLCC---SMD-SMT_YAGEO-YAGEO-CC1206KKX7RBBB152_C107187.html
footprint CAP-1206 (1206 (3216M) Capacitor)
pins: 1, 2

## CC1206KKX7RBBB182
designator C?  Capacitance: 1.8nF  (hidden comment: *)
Capacitor, Ceramic (MLCC), 1.8nF, ±10%, 500V, X7R, ±10%, SMD 1206; Manufacturer: YAGEO; Manufacturer Part Number: CC1206KKX7RBBB182; Package Size: 1206; JLCPCB Basic Part: No; JLCPCB Part Number: C327029; Supplier 1: LCSC; Category: Capacitors - MLCC; Supplier Part Number 1: C327029; Tolerance: ±10%; Voltage Rating: 500V; Temperature Coefficient: X7R; RoHS: Yes; ComponentLink1Description: Datasheet; ComponentLink1URL: https://wmsc.lcsc.com/wmsc/upload/file/pdf/v2/lcsc/1811141240_YAGEO-CC1206KKX7RBBB182_C327029.pdf; ComponentLink2Description: JLCPCB Part URL; ComponentLink2URL: https://jlcpcb.com/partdetail/C327029; ComponentLink3Description: LCSC Part URL; ComponentLink3URL: https://lcsc.com/product-detail/Multilayer-Ceramic-Capacitors-MLCC---SMD-SMT_YAGEO-YAGEO-CC1206KKX7RBBB182_C327029.html
footprint CAP-1206 (1206 (3216M) Capacitor)
pins: 1, 2

## CC1206KKX7RBBB221
designator C?  Capacitance: 220pF  (hidden comment: *)
Capacitor, Ceramic (MLCC), 220pF, ±10%, 500V, X7R, ±10%, SMD 1206; Manufacturer: YAGEO; Manufacturer Part Number: CC1206KKX7RBBB221; Package Size: 1206; JLCPCB Basic Part: No; JLCPCB Part Number: C277485; Supplier 1: LCSC; Category: Capacitors - MLCC; Supplier Part Number 1: C277485; Tolerance: ±10%; Voltage Rating: 500V; Temperature Coefficient: X7R; RoHS: Yes; ComponentLink1Description: Datasheet; ComponentLink1URL: https://wmsc.lcsc.com/wmsc/upload/file/pdf/v2/lcsc/2304140030_YAGEO-CC1206KKX7RBBB221_C277485.pdf; ComponentLink2Description: JLCPCB Part URL; ComponentLink2URL: https://jlcpcb.com/partdetail/C277485; ComponentLink3Description: LCSC Part URL; ComponentLink3URL: https://lcsc.com/product-detail/Multilayer-Ceramic-Capacitors-MLCC---SMD-SMT_YAGEO-YAGEO-CC1206KKX7RBBB221_C277485.html
footprint CAP-1206 (1206 (3216M) Capacitor)
pins: 1, 2
